# Altium footprint library IC_SMD_DUAL.PCBLIB: 137 footprints (part 8 of 9)
Each footprint in its own frame and in the unit in brackets; x right, y up, seen from the top. Pads: shape width x height; smd on the part's side, far side on the other; paste and mask are expansions set on the pad; w line width, h text height; cw(c..) or ccw(c..) is an arc to the next point about the centre after c.
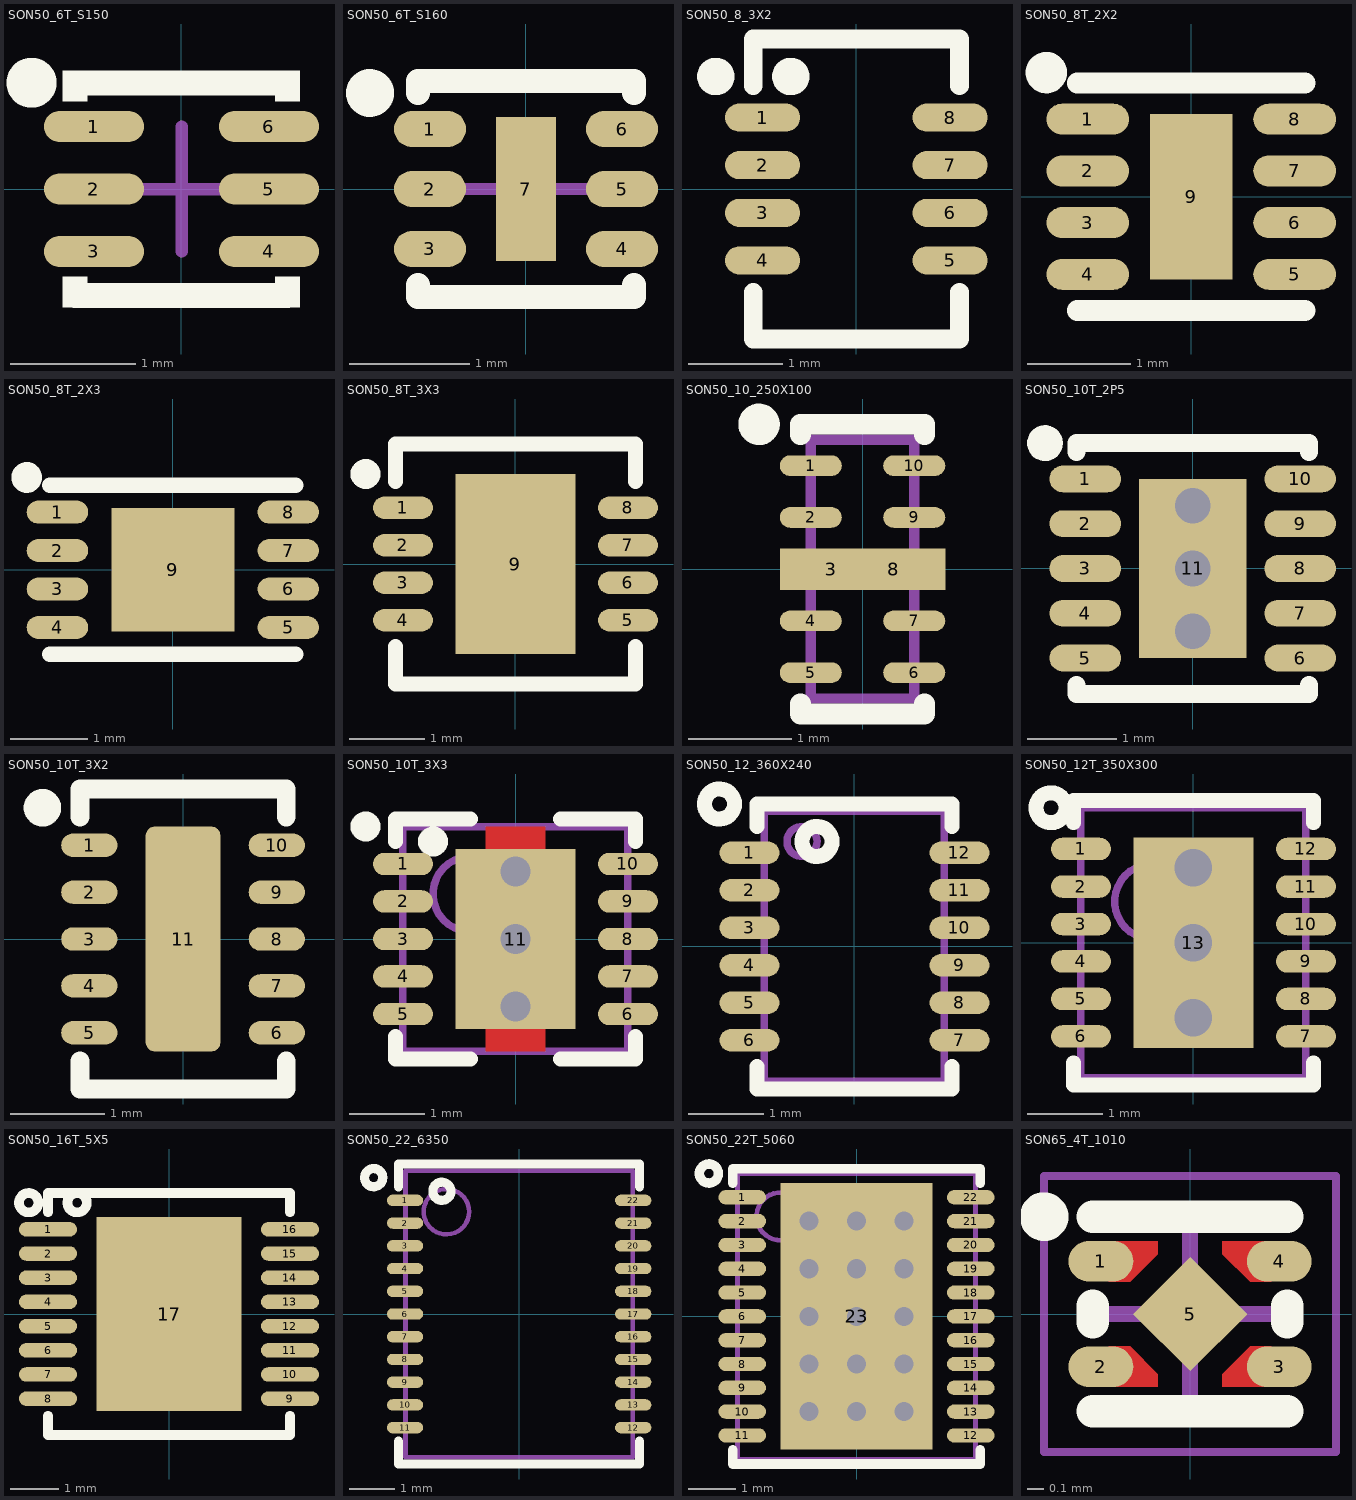
[diagram p7: the footprints below, top view; thin cyan lines are the x and y axes]

## SON50_6T_S150 [mm] "WSON DSE,  6-Lead DFN Pitch: 0.5mm 1.5x1.5x0.8mm"
height 0.8
pads (6):
  oval 0.8x0.25 smd mask+0.075: 1(-0.7,0.5) 2(-0.7,0) 3(-0.7,-0.5) 4(0.7,-0.5) 5(0.7,0) 6(0.7,0.5)
TopOverlay:
  circle w0.2: c-1.2,0.85 r0.1
  rectangle: -0.95,0.7 -0.75,0.95
  region: 0.95,0.95 0.75,0.95 0.75,0.7 0.95,0.7
  region: 0.95,-0.7 0.75,-0.7 0.75,-0.95 0.95,-0.95
  rectangle: -0.95,-0.95 -0.75,-0.7
  lines w0.2: -0.85,-0.85 0.85,-0.85 ; -0.85,0.85 0.85,0.85
Mechanical15:
  lines w0.1: -0.5,0 0.5,0 ; 0,-0.5 0,0.5
3D body "DSE0006A.stp": height 0.77, standoff -0.03, extent -0.75,-0.75 0.75,0.75

## SON50_6T_S160 [mm] "SLP1616P6 DGN08   6-Lead DFN Pitch: 0.5mm 1.6x1.6x0.6mm with Thermal pad"
height 0.6
pads (7):
  oval 0.6x0.3 smd mask+0.075: 1(-0.8,0.5) 2(-0.8,0) 3(-0.8,-0.5) 4(0.8,-0.5) 5(0.8,0) 6(0.8,0.5)
  rect 0.5x1.2 smd mask+0.075: 7(0,0)
TopOverlay:
  circle w0.2: c-1.3,0.8 r0.1
  lines w0.2: -0.9,-0.8 -0.9,-0.9 0.9,-0.9 0.9,-0.8 ; -0.9,0.8 -0.9,0.9 0.9,0.9 0.9,0.8
Mechanical15:
  lines w0.1: -0.5,0 0.5,0 ; 0,-0.5 0,0.5
3D body "User Library-SLP1616P6.step": height 0.55, standoff -0.03, extent -0.8,-0.8 0.8,0.8

## SON50_8_3X2 [mm]
height 0.8
pads (8):
  oval 0.8x0.3 smd mask+0.075: 1(-1,0.762) 2(-1,0.254) 3(-1,-0.254) 4(-1,-0.762) 5(1,-0.762) 6(1,-0.254) 7(1,0.254) 8(1,0.762)
TopOverlay:
  circle w0.2: c-0.7,1.2 r0.1
  circle w0.2: c-1.5,1.2 r0.1
  lines w0.2: -1.1,-1.1 -1.1,-1.6 1.1,-1.6 1.1,-1.1 ; -1.1,1.1 -1.1,1.6 1.1,1.6 1.1,1.1
3D body: height 0.8, standoff 0, extent -1,-1.5 1,1.5

## SON50_8T_2X2 [mm] "DSG PWSON (TI), Pitch: 0.5mm 2x2x0.8mm with Thermal pad"
height 0.8
pads (9):
  oval 0.8x0.3 smd mask+0.075: 1(-1,0.75) 2(-1,0.25) 3(-1,-0.25) 4(-1,-0.75) 5(1,-0.75) 6(1,-0.25) 7(1,0.25) 8(1,0.75)
  rect 0.8x1.6 smd mask+0.075: 9(0,0)
TopOverlay:
  circle w0.2: c-1.4,1.2 r0.1
  lines w0.2: -1.1,-1.1 1.1,-1.1 ; -1.1,1.1 1.1,1.1
3D body "User Library-SON8-2x2mm-1.step": height 0.77, standoff -0.03, extent -1,-1 1,1

## SON50_8T_2X3 [mm] "TDFN, UFDFPN8, Pitch: 0.5mm 2x3x0.8mm with Thermal pad"
height 0.8
pads (9):
  oval 0.8x0.3 smd mask+0.075: 1(-1.5,0.75) 2(-1.5,0.25) 3(-1.5,-0.25) 4(-1.5,-0.75) 5(1.5,-0.75) 6(1.5,-0.25) 7(1.5,0.25) 8(1.5,0.75)
  rect 1.6x1.6 smd mask+0.075: 9(0,0)
TopOverlay:
  circle w0.2: c-1.9,1.2 r0.1
  lines w0.2: -1.6,-1.1 1.6,-1.1 ; -1.6,1.1 1.6,1.1
3D body "User Library-TDFN-8-1.STEP": height 0.8, standoff 0, extent -1.5,-1 1.5,1

## SON50_8T_3X3 [mm] "WSON-8, DRG, LFCSP_WD, 3X3mm 0.5mm pitch with Thermal pad"
height 0.8
pads (9):
  oval 0.8x0.3 smd mask+0.075: 1(-1.5,0.75) 2(-1.5,0.25) 3(-1.5,-0.25) 4(-1.5,-0.75) 5(1.5,-0.75) 6(1.5,-0.25) 7(1.5,0.25) 8(1.5,0.75)
  rect 1.6x2.4 smd mask+0.075: 9(0,0)
TopOverlay:
  circle w0.2: c-2,1.2 r0.1
  lines w0.2: -1.6,-1.1 -1.6,-1.6 1.6,-1.6 1.6,-1.1 ; -1.6,1.1 -1.6,1.6 1.6,1.6 1.6,1.1
3D body: height 0.1, standoff 0, extent -0.7,-1.2 0.7,1.2
3D body: height 0.2, standoff 0, extent 1.05,0.625 1.55,0.875
3D body: height 0.2, standoff 0, extent 1.05,0.125 1.55,0.375
3D body: height 0.2, standoff 0, extent 1.05,-0.375 1.55,-0.125
3D body: height 0.2, standoff 0, extent 1.05,-0.875 1.55,-0.625
3D body: height 0.2, standoff 0, extent -1.55,-0.875 -1.05,-0.625
3D body: height 0.2, standoff 0, extent -1.55,-0.375 -1.05,-0.125
3D body: height 0.2, standoff 0, extent -1.55,0.125 -1.05,0.375
3D body: height 0.2, standoff 0, extent -1.55,0.625 -1.05,0.875
3D body: height 0.8, standoff 0.05, extent -1.5,-1.5 1.5,1.5

## SON50_10_250X100 [mm] "uDFN-10, MO-229 (JEDEC), SLP2510P8  - 2.5x1.0x0.5mm"
height 0.5
pads (10):
  oval 0.6x0.2 smd mask+0.05: 1(-0.5,1) 2(-0.5,0.5) 4(-0.5,-0.5) 5(-0.5,-1) 6(0.5,-1) 7(0.5,-0.5) 9(0.5,0.5) 10(0.5,1)
  rect 1x0.4 smd mask+0.05: 3(-0.3,0) 8(0.3,0)
TopOverlay:
  circle w0.2: c-1,1.4 r0.1
  lines w0.2: -0.6,-1.3 -0.6,-1.4 0.6,-1.4 0.6,-1.3 ; -0.6,1.3 -0.6,1.4 0.6,1.4 0.6,1.3
Mechanical13:
  lines w0.1: -0.5,-1.25 -0.5,1.25 0.5,1.25 0.5,-1.25 -0.5,-1.25
3D body: height 0.5, standoff 0, extent -0.5,-1.25 0.5,1.25

## SON50_10T_2P5 [mm] "DSK SON(TI), DFN2626-10, 2.5X2.5mm, Pitch: 0.5mm with thermal pad"
height 0.8
pads (11):
  oval 0.8x0.3 smd mask+0.075: 1(-1.2,1) 2(-1.2,0.5) 3(-1.2,0) 4(-1.2,-0.5) 5(-1.2,-1) 6(1.2,-1) 7(1.2,-0.5) 8(1.2,0) 9(1.2,0.5) 10(1.2,1)
  rect 1.2x2 smd mask+0.1: 11(0,0)
via 0,0 diameter 0.6 hole 0.4
via 0,0.7 diameter 0.6 hole 0.4
via 0,-0.7 diameter 0.6 hole 0.4
TopOverlay:
  circle w0.2: c-1.65,1.4 r0.1
  lines w0.2: -1.3,-1.3 -1.3,-1.4 1.3,-1.4 1.3,-1.3 ; -1.3,1.3 -1.3,1.4 1.3,1.4 1.3,1.3
3D body "SON127P600-8N.step": height 0.8, standoff 0, extent -1.251,-1.25 1.251,1.25

## SON50_10T_3X2 [mm] "DQC, PWSON-N10, Pitch: 0.5mm, 2X3mm"
pads (11):
  oval 0.6x0.25 smd mask+0.07: 1(-1,1) 2(-1,0.5) 3(-1,0) 4(-1,-0.5) 5(-1,-1) 6(1,-1) 7(1,-0.5) 8(1,0) 9(1,0.5) 10(1,1)
  rrect25% 0.8x2.4 smd mask+0.07: 11(0,0)
TopOverlay:
  circle w0.2: c-1.5,1.4 r0.1
  lines w0.2: -1.1,-1.3 -1.1,-1.6 1.1,-1.6 1.1,-1.3 ; -1.1,1.3 -1.1,1.6 1.1,1.6 1.1,1.3
Mechanical 29:
  text ".Designator" at 0.4,-0.7 h0.6
3D body: height 0.8, standoff 0, extent -1,-1.5 1,1.5

## SON50_10T_3X3 [mm] "DRC SON(TI), 10 TDFN (MAXIM), 3X3mm, Pitch: 0.5mm with thermal pad"
height 0.8
pads (11):
  oval 0.8x0.3 smd mask+0.075: 1(-1.5,1) 2(-1.5,0.5) 3(-1.5,0) 4(-1.5,-0.5) 5(-1.5,-1) 6(1.5,-1) 7(1.5,-0.5) 8(1.5,0) 9(1.5,0.5) 10(1.5,1)
  rect 1.6x2.4 smd mask+0.1: 11(0,0)
via 0,0 diameter 0.6 hole 0.4
via 0,0.9 diameter 0.6 hole 0.4
via 0,-0.9 diameter 0.6 hole 0.4
TopLayer:
  rectangle: -0.4,-1.5 0.4,1.5
TopOverlay:
  circle w0.2: c-2,1.5 r0.1
  circle w0.2: c-1.1,1.3 r0.1
  lines w0.2: -1.6,-1.3 -1.6,-1.6 -0.6,-1.6 ; -1.6,1.3 -1.6,1.6 -0.6,1.6 ; 0.6,-1.6 1.6,-1.6 1.6,-1.3 ; 0.6,1.6 1.6,1.6 1.6,1.3
TopSolder:
  rectangle: -0.5,-1.6 0.5,1.6
Mechanical13:
  circle w0.1: c-0.6,0.6 r0.5
  lines w0.1: -1.5,-1.5 1.5,-1.5 1.5,1.5 -1.5,1.5 -1.5,-1.5
3D body: height 0.8, standoff 0, extent -1.5,-1.5 1.5,1.5

## SON50_12_360X240 [mm] "SOJ, 12-Leads, Body 3.6x2.4mm, Pitch 0.50mm"
height 1.2
pads (12):
  oval 0.8x0.3 smd: 1(-1.4,1.25) 2(-1.4,0.75) 3(-1.4,0.25) 4(-1.4,-0.25) 5(-1.4,-0.75) 6(-1.4,-1.25) 7(1.4,-1.25) 8(1.4,-0.75) 9(1.4,-0.25) 10(1.4,0.25) 11(1.4,0.75) 12(1.4,1.25)
TopOverlay:
  circle w0.2: c-1.8,1.9 r0.2
  circle w0.2: c-0.5,1.4 r0.2
  lines w0.2: -1.3,-1.6 -1.3,-1.9 1.3,-1.9 1.3,-1.6 ; -1.3,1.6 -1.3,1.9 1.3,1.9 1.3,1.6
Mechanical13:
  circle w0.1: c-0.7,1.4 r0.2
  lines w0.1: -1.2,-1.8 1.2,-1.8 1.2,1.8 -1.2,1.8 -1.2,-1.8
3D body: height 1.2, standoff 0, extent -1.2,-1.8 1.2,1.8

## SON50_12T_350X300 [mm]
pads (13):
  oval 0.8x0.3 smd: 1(-1.5,1.25) 2(-1.5,0.75) 3(-1.5,0.25) 4(-1.5,-0.25) 5(-1.5,-0.75) 6(-1.5,-1.25) 7(1.5,-1.25) 8(1.5,-0.75) 9(1.5,-0.25) 10(1.5,0.25) 11(1.5,0.75) 12(1.5,1.25)
  rect 1.6x2.8 smd: 13(0,0)
via 0,-1 diameter 0.8 hole 0.5
via 0,1 diameter 0.8 hole 0.5
via 0,0 diameter 0.8 hole 0.5
TopOverlay:
  circle w0.2: c-1.9,1.8 r0.2
  lines w0.2: -1.6,-1.6 -1.6,-1.9 1.6,-1.9 1.6,-1.6 ; -1.6,1.6 -1.6,1.9 1.6,1.9 1.6,1.6
TopSolder:
  pour cut-out: 0,-0.6 -0.08,-0.6 -0.227,-0.661 -0.339,-0.773 -0.4,-0.92 -0.4,-1 -0.4,-1.08 -0.339,-1.227 -0.227,-1.339 -0.08,-1.4 0,-1.4 0.08,-1.4 0.227,-1.339 0.339,-1.227 0.4,-1.08 0.4,-1 0.4,-0.92 0.339,-0.773 0.227,-0.661 0.08,-0.6 0,-0.6
  pour cut-out: 0,0.4 -0.08,0.4 -0.227,0.339 -0.339,0.227 -0.4,0.08 -0.4,0 -0.4,-0.08 -0.339,-0.227 -0.227,-0.339 -0.08,-0.4 0,-0.4 0.08,-0.4 0.227,-0.339 0.339,-0.227 0.4,-0.08 0.4,0 0.4,0.08 0.339,0.227 0.227,0.339 0.08,0.4 0,0.4
  pour cut-out: 0,1.4 -0.08,1.4 -0.227,1.339 -0.339,1.227 -0.4,1.08 -0.4,1 -0.4,0.92 -0.339,0.773 -0.227,0.661 -0.08,0.6 0,0.6 0.08,0.6 0.227,0.661 0.339,0.773 0.4,0.92 0.4,1 0.4,1.08 0.339,1.227 0.227,1.339 0.08,1.4 0,1.4
  region: 0.9,-1.5 -0.9,-1.5 -0.9,1.5 0.9,1.5 hole: 0,1.408 0,1.4 0,1.408 -0.156,1.377 -0.288,1.288 -0.377,1.156 -0.408,1 -0.377,0.844 -0.288,0.712 -0.156,0.623 0,0.592 0,0.6 0,0.592 0.156,0.623 0.288,0.712 0.377,0.844 0.408,1 0.377,1.156 0.288,1.288 0.156,1.377 hole: 0,0.408 0,0.4 0,0.408 -0.156,0.377 -0.288,0.288 -0.377,0.156 -0.408,0 -0.377,-0.156 -0.288,-0.288 -0.156,-0.377 0,-0.408 0,-0.4 0,-0.408 0.156,-0.377 0.288,-0.288 0.377,-0.156 0.408,0 0.377,0.156 0.288,0.288 0.156,0.377 hole: 0,-0.592 0,-0.6 0,-0.592 -0.156,-0.623 -0.288,-0.712 -0.377,-0.844 -0.408,-1 -0.377,-1.156 -0.288,-1.288 -0.156,-1.377 0,-1.408 0,-1.4 0,-1.408 0.156,-1.377 0.288,-1.288 0.377,-1.156 0.408,-1 0.377,-0.844 0.288,-0.712 0.156,-0.623
Mechanical13:
  circle w0.1: c-0.55,0.55 r0.5
  lines w0.1: -1.5,-1.8 -1.5,1.8 1.5,1.8 1.5,-1.8 -1.5,-1.8
3D body: height 1, standoff 0, extent -1.5,-1.8 1.5,1.8

## SON50_16T_5X5 [mm]
pads (17):
  oval 1.2x0.3 smd mask+0.075: 1(-2.5,1.75) 2(-2.5,1.25) 3(-2.5,0.75) 4(-2.5,0.25) 5(-2.5,-0.25) 6(-2.5,-0.75) 7(-2.5,-1.25) 8(-2.5,-1.75) 9(2.5,-1.75) 10(2.5,-1.25) 11(2.5,-0.75) 12(2.5,-0.25) 13(2.5,0.25) 14(2.5,0.75) 15(2.5,1.25) 16(2.5,1.75)
  rect 3x4 smd mask+0.1: 17(0,0)
TopOverlay:
  circle w0.2: c-2.9,2.3 r0.2
  circle w0.2: c-1.9,2.3 r0.2
  lines w0.2: -2.5,-2.1 -2.5,-2.5 2.5,-2.5 2.5,-2.1 ; -2.5,2.1 -2.5,2.5 2.5,2.5 2.5,2.1

## SON50_22_6350 [mm] "SON-22, 0.5mm pitch, 5x6.3x1.3mm"
height 1.3
pads (22):
  oval 0.8x0.25 smd mask+0.075: 1(-2.51,2.5) 2(-2.51,2) 3(-2.51,1.5) 4(-2.51,1) 5(-2.51,0.5) 6(-2.51,0) 7(-2.51,-0.5) 8(-2.51,-1) 9(-2.51,-1.5) 10(-2.51,-2) 11(-2.51,-2.5) 12(2.51,-2.5) 13(2.51,-2) 14(2.51,-1.5) 15(2.51,-1) 16(2.51,-0.5) 17(2.51,0) 18(2.51,0.5) 19(2.51,1) 20(2.51,1.5) 21(2.51,2) 22(2.51,2.5)
TopOverlay:
  circle w0.2: c-3.2,3 r0.2
  circle w0.2: c-1.7,2.7 r0.2
  lines w0.2: -2.65,-2.8 -2.65,-3.3 2.65,-3.3 2.65,-2.8 ; -2.65,2.8 -2.65,3.3 2.65,3.3 2.65,2.8
Mechanical13:
  circle w0.1: c-1.6,2.25 r0.5
  lines w0.1: -2.5,-3.15 -2.5,3.15 2.5,3.15 2.5,-3.15 -2.5,-3.15
3D body "SON50_22_5063.step": height 1.3, standoff 0, extent -2.501,-3.15 2.501,3.15

## SON50_22T_5060 [mm] "DQP, PQFN-22, SON-22, 5X6X1.5mm, 0.5mm pitch"
height 1.5
pads (23):
  oval 1x0.3 smd mask+0.075: 1(-2.4,2.5) 2(-2.4,2) 3(-2.4,1.5) 4(-2.4,1) 5(-2.4,0.5) 6(-2.4,0) 7(-2.4,-0.5) 8(-2.4,-1) 9(-2.4,-1.5) 10(-2.4,-2) 11(-2.4,-2.5) 12(2.4,-2.5) 13(2.4,-2) 14(2.4,-1.5) 15(2.4,-1) 16(2.4,-0.5) 17(2.4,0) 18(2.4,0.5) 19(2.4,1) 20(2.4,1.5) 21(2.4,2) 22(2.4,2.5)
  rect 3.2x5.6 smd paste-1.6: 23(0,0)
via -1,2 diameter 0.6 hole 0.4
via 0,2 diameter 0.6 hole 0.4
via 1,2 diameter 0.6 hole 0.4
via -1,1 diameter 0.6 hole 0.4
via 0,1 diameter 0.6 hole 0.4
via 1,1 diameter 0.6 hole 0.4
via -1,0 diameter 0.6 hole 0.4
via 0,0 diameter 0.6 hole 0.4
via 1,0 diameter 0.6 hole 0.4
via -1,-1 diameter 0.6 hole 0.4
via 0,-1 diameter 0.6 hole 0.4
via 1,-1 diameter 0.6 hole 0.4
via -1,-2 diameter 0.6 hole 0.4
via 0,-2 diameter 0.6 hole 0.4
via 1,-2 diameter 0.6 hole 0.4
TopOverlay:
  circle w0.2: c-3.1,3 r0.2
  lines w0.2: -2.6,-2.8 -2.6,-3.1 2.6,-3.1 2.6,-2.8 ; -2.6,2.8 -2.6,3.1 2.6,3.1 2.6,2.8
TopPaste:
  rectangle: -1.5,1.45 -0.1,2.6
  rectangle: -1.5,0.1 -0.1,1.25
  rectangle: -1.5,-1.25 -0.1,-0.1
  rectangle: -1.5,-2.6 -0.1,-1.45
  rectangle: 0.1,1.45 1.5,2.6
  rectangle: 0.1,0.1 1.5,1.25
  rectangle: 0.1,-1.25 1.5,-0.1
  rectangle: 0.1,-2.6 1.5,-1.45
Mechanical13:
  circle w0.1: c-1.6,2.1 r0.5
  lines w0.1: -2.5,-3 -2.5,3 2.5,3 2.5,-3 -2.5,-3
3D body "SON127P600-8N.step": height 1.5, standoff 0, extent -2.501,-3 2.501,3

## SON65_4T_1010 [mm] "DFN(PLP)1010-4, DFN1010C-4, 1.0X1.0mm, 0.65mm pitch"
height 0.6
pads (5):
  oval 0.4x0.25 smd mask+0.05: 1(-0.55,0.325) 2(-0.55,-0.325) 3(0.55,-0.325) 4(0.55,0.325)
  rect 0.5x0.5 smd rot 45 mask+0.05: 5(0,0)
TopLayer:
  region: 0.5,0.45 0.2,0.45 0.2,0.37 0.37,0.2 0.5,0.2
  region: 0.5,-0.45 0.2,-0.45 0.2,-0.37 0.37,-0.2 0.5,-0.2
  region: -0.5,-0.45 -0.2,-0.45 -0.2,-0.37 -0.37,-0.2 -0.5,-0.2
  region: -0.5,0.45 -0.2,0.45 -0.2,0.37 -0.37,0.2 -0.5,0.2
TopOverlay:
  circle w0.2: c-0.9,0.6 r0.05
  lines w0.2: -0.6,-0.6 0.6,-0.6 ; -0.6,-0.05 -0.6,0.05 ; -0.6,0.6 0.6,0.6 ; 0.6,-0.05 0.6,0.05
TopSolder:
  region: 0.5,0.5 0.15,0.5 0.15,0.37 0.37,0.15 0.5,0.15
  region: 0.5,-0.5 0.15,-0.5 0.15,-0.37 0.37,-0.15 0.5,-0.15
  region: -0.5,-0.5 -0.15,-0.5 -0.15,-0.37 -0.37,-0.15 -0.5,-0.15
  region: -0.5,0.5 -0.15,0.5 -0.15,0.37 -0.37,0.15 -0.5,0.15
Mechanical15:
  lines w0.05: -0.9,-0.85 -0.9,0.85 0.9,0.85 0.9,-0.85 -0.9,-0.85
  lines w0.1: -0.5,0 0.5,0 ; 0,-0.5 0,0.5
3D body: height 0.2, standoff 0, extent -0.51,0.2 -0.2,0.45
3D body: height 0.1, standoff 0, extent -0.354,-0.353 0.354,0.354
3D body: height 0.6, standoff 0.01, extent -0.5,-0.5 0.5,0.5
3D body: height 0.61, standoff 0.6, extent -0.4,0.2 -0.2,0.4
3D body: height 0.2, standoff 0, extent -0.51,-0.45 -0.2,-0.2
3D body: height 0.2, standoff 0, extent 0.2,-0.45 0.51,-0.2
3D body: height 0.2, standoff 0, extent 0.2,0.2 0.51,0.45